# Altium footprint library con-molex.PCBLIB: 368 footprints (part 12 of 26)
Each footprint in its own frame and in the unit in brackets; x right, y up, seen from the top. Pads: shape width x height; smd on the part's side, far side on the other; paste and mask are expansions set on the pad; w line width, h text height; cw(c..) or ccw(c..) is an arc to the next point about the centre after c.
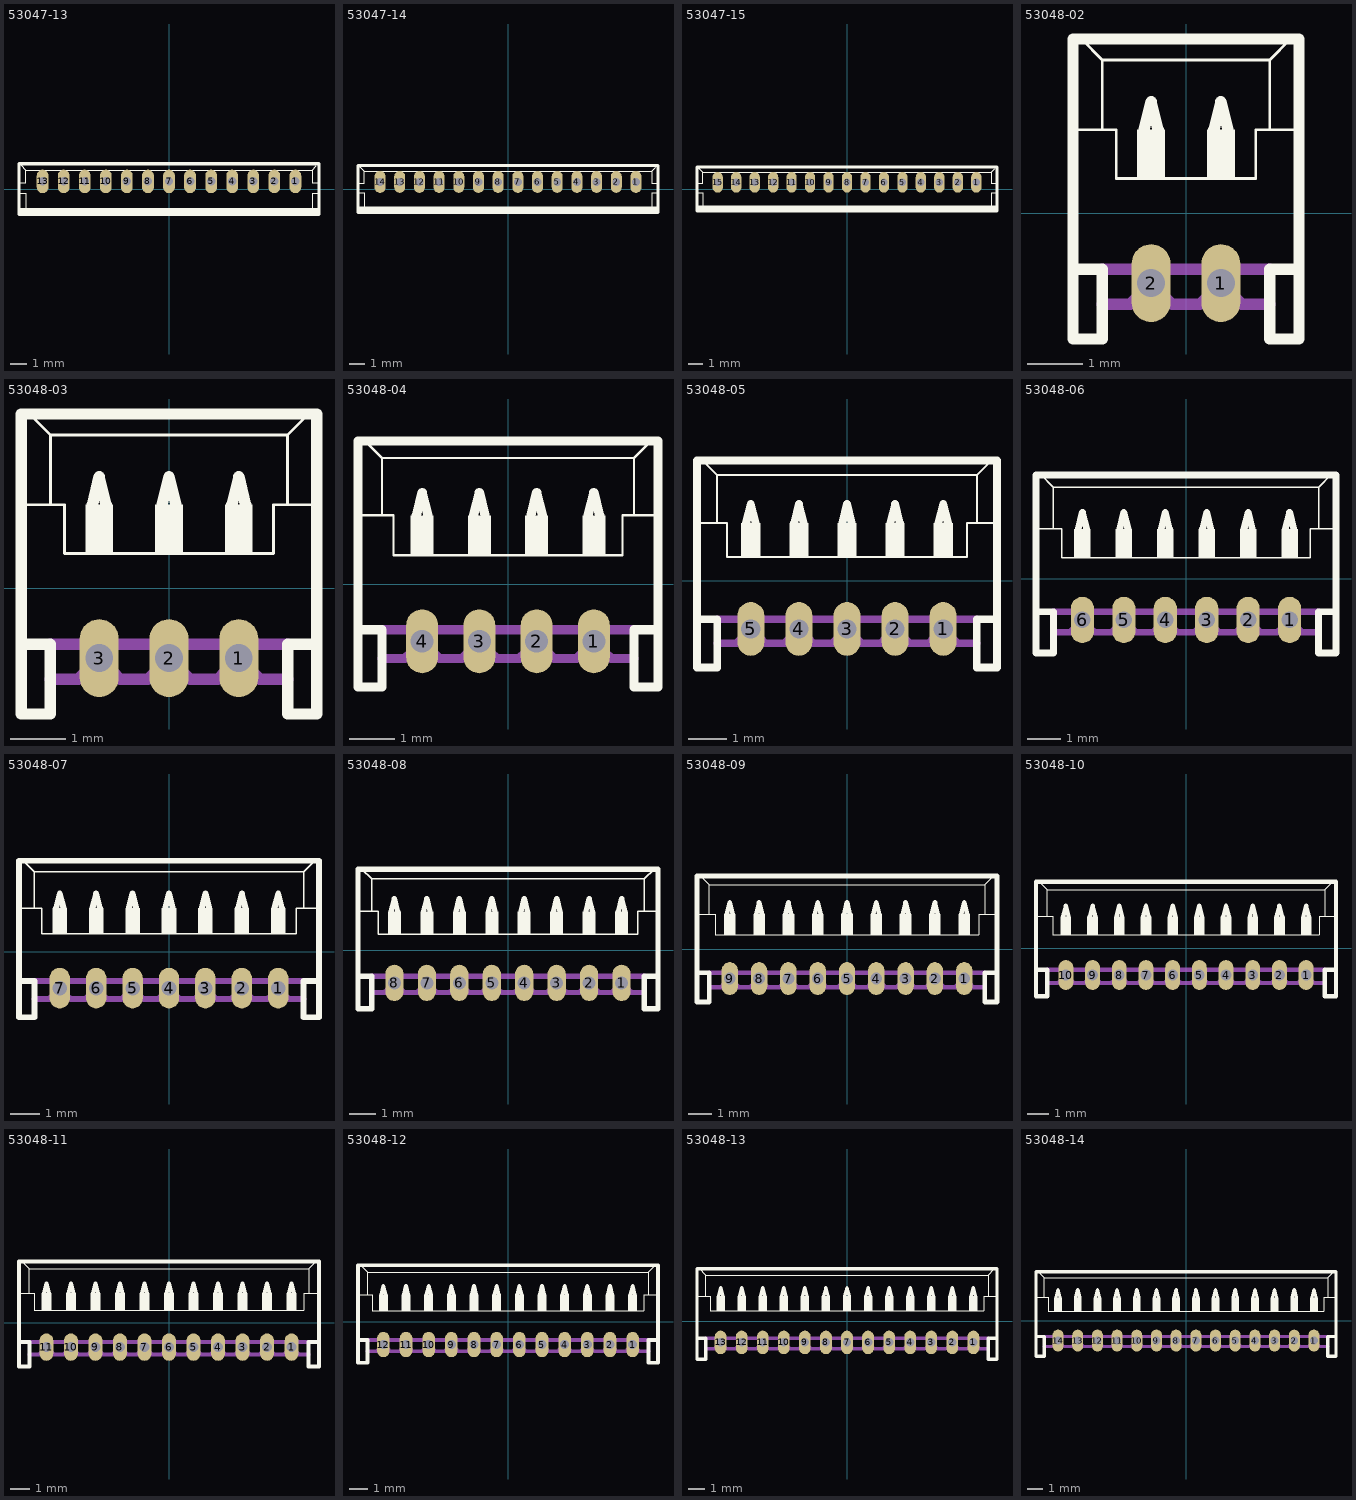
[diagram p11: the footprints below, top view; thin cyan lines are the x and y axes]

## 53047-13 [mil]
pads (13):
  oval 27.5x55 hole 19.69: 1(295.28,17.72) 2(246.06,17.72) 3(196.85,17.72) 4(147.64,17.72) 5(98.43,17.72) 6(49.21,17.72) 7(0,17.72) 8(-49.21,17.72) 9(-98.43,17.72) 10(-147.64,17.72) 11(-196.85,17.72) 12(-246.06,17.72) 13(-295.28,17.72)
Top Overlay:
  rectangle: -349.41,-59.06 349.41,-44.29
  lines w2: -349.41,-9.84 -334.65,-9.84 -334.65,-49.21 ; -349.41,14.76 -334.65,14.76 -334.65,44.29 ; -344.49,54.13 -334.65,44.29 ; 334.65,-49.21 334.65,-9.84 349.41,-9.84 ; 344.49,54.13 334.65,44.29 ; 349.41,14.76 334.65,14.76 334.65,44.29 ; -334.65,44.29 334.65,44.29
  lines w8: -350.39,-59.06 350.39,-59.06 350.39,59.06 -350.39,59.06 -350.39,-59.06

## 53047-14 [mil]
pads (14):
  oval 27.5x55 hole 19.69: 1(319.88,17.72) 2(270.67,17.72) 3(221.46,17.72) 4(172.24,17.72) 5(123.03,17.72) 6(73.82,17.72) 7(24.61,17.72) 8(-24.61,17.72) 9(-73.82,17.72) 10(-123.03,17.72) 11(-172.24,17.72) 12(-221.46,17.72) 13(-270.67,17.72) 14(-319.88,17.72)
Top Overlay:
  rectangle: -374.02,-59.06 374.02,-44.29
  lines w2: -374.02,-9.84 -359.25,-9.84 -359.25,-49.21 ; -374.02,14.76 -359.25,14.76 -359.25,44.29 ; -369.09,54.13 -359.25,44.29 ; 359.25,-49.21 359.25,-9.84 374.02,-9.84 ; 369.09,54.13 359.25,44.29 ; 374.02,14.76 359.25,14.76 359.25,44.29 ; -359.25,44.29 359.25,44.29
  lines w8: -375,-59.06 375,-59.06 375,59.06 -375,59.06 -375,-59.06

## 53047-15 [mil]
pads (15):
  oval 27.5x55 hole 19.69: 1(344.49,17.72) 2(295.28,17.72) 3(246.06,17.72) 4(196.85,17.72) 5(147.64,17.72) 6(98.43,17.72) 7(49.21,17.72) 8(0,17.72) 9(-49.21,17.72) 10(-98.43,17.72) 11(-147.64,17.72) 12(-196.85,17.72) 13(-246.06,17.72) 14(-295.28,17.72) 15(-344.49,17.72)
Top Overlay:
  rectangle: -398.62,-59.06 398.62,-44.29
  lines w2: -398.62,-9.84 -383.86,-9.84 -383.86,-49.21 ; -398.62,14.76 -383.86,14.76 -383.86,44.29 ; -393.7,54.13 -383.86,44.29 ; 383.86,-49.21 383.86,-9.84 398.62,-9.84 ; 393.7,54.13 383.86,44.29 ; 398.62,14.76 383.86,14.76 383.86,44.29 ; -383.86,44.29 383.86,44.29
  lines w8: -399.61,-59.06 399.61,-59.06 399.61,59.06 -399.61,59.06 -399.61,-59.06

## 53048-02 [mil]
pads (2):
  oval 27.5x55 hole 19.69: 1(24.61,-49.21) 2(-24.61,-49.21)
Top Overlay:
  rectangle: -34.45,24.61 -14.76,59.06
  rectangle: 14.76,24.61 34.45,59.06
  lines w2: -78.74,59.06 -59.06,59.06 ; -73.82,123.03 -59.06,108.27 ; 73.82,123.03 59.06,108.27 ; 78.74,59.06 59.06,59.06 ; -59.06,59.06 -49.21,59.06 -49.21,24.61 49.21,24.61 49.21,59.06 59.06,59.06 ; -59.06,59.06 -59.06,108.27 ; -59.06,108.27 59.06,108.27 ; 59.06,59.06 59.06,108.27
  lines w8: -78.74,-39.37 -59.06,-39.37 -59.06,-88.58 -79.72,-88.58 -79.72,123.03 -73.82,123.03 73.82,123.03 79.72,123.03 79.72,-88.58 59.06,-88.58 59.06,-39.37 78.74,-39.37 ; -29.53,59.06 -24.61,78.74 -19.69,59.06 ; 19.69,59.06 24.61,78.74 29.53,59.06
Mechanical 16:
  rectangle: -34.45,-59.06 -14.76,-39.37
  rectangle: 14.76,-59.06 34.45,-39.37
  lines w8: -59.06,-63.98 -39.37,-63.98 -34.45,-59.06 ; -59.06,-39.37 59.06,-39.37 ; -14.76,-59.06 -9.84,-63.98 9.84,-63.98 14.76,-59.06 ; 34.45,-59.06 39.37,-63.98 59.06,-63.98

## 53048-03 [mil]
pads (3):
  oval 27.5x55 hole 19.69: 1(49.21,-49.21) 2(0,-49.21) 3(-49.21,-49.21)
Top Overlay:
  rectangle: -59.06,24.61 -39.37,59.06
  rectangle: -9.84,24.61 9.84,59.06
  rectangle: 39.37,24.61 59.06,59.06
  lines w2: -103.35,59.06 -83.66,59.06 ; -98.43,123.03 -83.66,108.27 ; 98.43,123.03 83.66,108.27 ; 103.35,59.06 83.66,59.06 ; -83.66,59.06 -73.82,59.06 -73.82,24.61 73.82,24.61 73.82,59.06 83.66,59.06 ; -83.66,59.06 -83.66,108.27 ; -83.66,108.27 83.66,108.27 ; 83.66,59.06 83.66,108.27
  lines w8: -103.35,-39.37 -83.66,-39.37 -83.66,-88.58 -104.33,-88.58 -104.33,123.03 -98.43,123.03 98.43,123.03 104.33,123.03 104.33,-88.58 83.66,-88.58 83.66,-39.37 103.35,-39.37 ; -54.13,59.06 -49.21,78.74 -44.29,59.06 ; -4.92,59.06 0,78.74 4.92,59.06 ; 44.29,59.06 49.21,78.74 54.13,59.06
Mechanical 16:
  rectangle: -59.06,-59.06 -39.37,-39.37
  rectangle: -9.84,-59.06 9.84,-39.37
  rectangle: 39.37,-59.06 59.06,-39.37
  lines w8: -83.66,-63.98 -63.98,-63.98 -59.06,-59.06 ; -83.66,-39.37 83.66,-39.37 ; -39.37,-59.06 -34.45,-63.98 -14.76,-63.98 -9.84,-59.06 ; 9.84,-59.06 14.76,-63.98 34.45,-63.98 39.37,-59.06 ; 59.06,-59.06 63.98,-63.98 83.66,-63.98

## 53048-04 [mil]
pads (4):
  oval 27.5x55 hole 19.69: 1(73.82,-49.21) 2(24.61,-49.21) 3(-24.61,-49.21) 4(-73.82,-49.21)
Top Overlay:
  rectangle: -83.66,24.61 -63.98,59.06
  rectangle: -34.45,24.61 -14.76,59.06
  rectangle: 14.76,24.61 34.45,59.06
  rectangle: 63.98,24.61 83.66,59.06
  lines w2: -127.95,59.06 -108.27,59.06 ; -123.03,123.03 -108.27,108.27 ; 123.03,123.03 108.27,108.27 ; 127.95,59.06 108.27,59.06 ; -108.27,59.06 -98.43,59.06 -98.43,24.61 98.43,24.61 98.43,59.06 108.27,59.06 ; -108.27,59.06 -108.27,108.27 ; -108.27,108.27 108.27,108.27 ; 108.27,59.06 108.27,108.27
  lines w8: -127.95,-39.37 -108.27,-39.37 -108.27,-88.58 -128.94,-88.58 -128.94,123.03 -123.03,123.03 123.03,123.03 128.94,123.03 128.94,-88.58 108.27,-88.58 108.27,-39.37 127.95,-39.37 ; -78.74,59.06 -73.82,78.74 -68.9,59.06 ; -29.53,59.06 -24.61,78.74 -19.69,59.06 ; 19.69,59.06 24.61,78.74 29.53,59.06 ; 68.9,59.06 73.82,78.74 78.74,59.06
Mechanical 16:
  rectangle: -83.66,-59.06 -63.98,-39.37
  rectangle: -34.45,-59.06 -14.76,-39.37
  rectangle: 14.76,-59.06 34.45,-39.37
  rectangle: 63.98,-59.06 83.66,-39.37
  lines w8: -108.27,-63.98 -88.58,-63.98 -83.66,-59.06 ; -108.27,-39.37 108.27,-39.37 ; -63.98,-59.06 -59.06,-63.98 -39.37,-63.98 -34.45,-59.06 ; -14.76,-59.06 -9.84,-63.98 9.84,-63.98 14.76,-59.06 ; 34.45,-59.06 39.37,-63.98 59.06,-63.98 63.98,-59.06 ; 83.66,-59.06 88.58,-63.98 108.27,-63.98

## 53048-05 [mil]
pads (5):
  oval 27.5x55 hole 19.69: 1(98.43,-49.21) 2(49.21,-49.21) 3(0,-49.21) 4(-49.21,-49.21) 5(-98.43,-49.21)
Top Overlay:
  rectangle: -108.27,24.61 -88.58,59.06
  rectangle: -59.06,24.61 -39.37,59.06
  rectangle: -9.84,24.61 9.84,59.06
  rectangle: 39.37,24.61 59.06,59.06
  rectangle: 88.58,24.61 108.27,59.06
  lines w2: -152.56,59.06 -132.87,59.06 ; -147.64,123.03 -132.87,108.27 ; 147.64,123.03 132.87,108.27 ; 152.56,59.06 132.87,59.06 ; -132.87,59.06 -123.03,59.06 -123.03,24.61 123.03,24.61 123.03,59.06 132.87,59.06 ; -132.87,59.06 -132.87,108.27 ; -132.87,108.27 132.87,108.27 ; 132.87,59.06 132.87,108.27
  lines w8: -152.56,-39.37 -132.87,-39.37 -132.87,-88.58 -153.54,-88.58 -153.54,123.03 -147.64,123.03 147.64,123.03 153.54,123.03 153.54,-88.58 132.87,-88.58 132.87,-39.37 152.56,-39.37 ; -103.35,59.06 -98.43,78.74 -93.5,59.06 ; -54.13,59.06 -49.21,78.74 -44.29,59.06 ; -4.92,59.06 0,78.74 4.92,59.06 ; 44.29,59.06 49.21,78.74 54.13,59.06 ; 93.5,59.06 98.43,78.74 103.35,59.06
Mechanical 16:
  rectangle: -108.27,-59.06 -88.58,-39.37
  rectangle: -59.06,-59.06 -39.37,-39.37
  rectangle: -9.84,-59.06 9.84,-39.37
  rectangle: 39.37,-59.06 59.06,-39.37
  rectangle: 88.58,-59.06 108.27,-39.37
  lines w8: -132.87,-63.98 -113.19,-63.98 -108.27,-59.06 ; -132.87,-39.37 132.87,-39.37 ; -88.58,-59.06 -83.66,-63.98 -63.98,-63.98 -59.06,-59.06 ; -39.37,-59.06 -34.45,-63.98 -14.76,-63.98 -9.84,-59.06 ; 9.84,-59.06 14.76,-63.98 34.45,-63.98 39.37,-59.06 ; 59.06,-59.06 63.98,-63.98 83.66,-63.98 88.58,-59.06 ; 108.27,-59.06 113.19,-63.98 132.87,-63.98

## 53048-06 [mil]
pads (6):
  oval 27.5x55 hole 19.69: 1(123.03,-49.21) 2(73.82,-49.21) 3(24.61,-49.21) 4(-24.61,-49.21) 5(-73.82,-49.21) 6(-123.03,-49.21)
Top Overlay:
  rectangle: -132.87,24.61 -113.19,59.06
  rectangle: -83.66,24.61 -63.98,59.06
  rectangle: -34.45,24.61 -14.76,59.06
  rectangle: 14.76,24.61 34.45,59.06
  rectangle: 63.98,24.61 83.66,59.06
  rectangle: 113.19,24.61 132.87,59.06
  lines w2: -177.17,59.06 -157.48,59.06 ; -172.24,123.03 -157.48,108.27 ; 172.24,123.03 157.48,108.27 ; 177.17,59.06 157.48,59.06 ; -157.48,59.06 -147.64,59.06 -147.64,24.61 147.64,24.61 147.64,59.06 157.48,59.06 ; -157.48,59.06 -157.48,108.27 ; -157.48,108.27 157.48,108.27 ; 157.48,59.06 157.48,108.27
  lines w8: -177.17,-39.37 -157.48,-39.37 -157.48,-88.58 -178.15,-88.58 -178.15,123.03 -172.24,123.03 172.24,123.03 178.15,123.03 178.15,-88.58 157.48,-88.58 157.48,-39.37 177.17,-39.37 ; -127.95,59.06 -123.03,78.74 -118.11,59.06 ; -78.74,59.06 -73.82,78.74 -68.9,59.06 ; -29.53,59.06 -24.61,78.74 -19.69,59.06 ; 19.69,59.06 24.61,78.74 29.53,59.06 ; 68.9,59.06 73.82,78.74 78.74,59.06 ; 118.11,59.06 123.03,78.74 127.95,59.06
Mechanical 16:
  rectangle: -132.87,-59.06 -113.19,-39.37
  rectangle: -83.66,-59.06 -63.98,-39.37
  rectangle: -34.45,-59.06 -14.76,-39.37
  rectangle: 14.76,-59.06 34.45,-39.37
  rectangle: 63.98,-59.06 83.66,-39.37
  rectangle: 113.19,-59.06 132.87,-39.37
  lines w8: -157.48,-63.98 -137.8,-63.98 -132.87,-59.06 ; -157.48,-39.37 157.48,-39.37 ; -113.19,-59.06 -108.27,-63.98 -88.58,-63.98 -83.66,-59.06 ; -63.98,-59.06 -59.06,-63.98 -39.37,-63.98 -34.45,-59.06 ; -14.76,-59.06 -9.84,-63.98 9.84,-63.98 14.76,-59.06 ; 34.45,-59.06 39.37,-63.98 59.06,-63.98 63.98,-59.06 ; 83.66,-59.06 88.58,-63.98 108.27,-63.98 113.19,-59.06 ; 132.87,-59.06 137.8,-63.98 157.48,-63.98

## 53048-07 [mil]
pads (7):
  oval 27.5x55 hole 19.69: 1(147.64,-49.21) 2(98.43,-49.21) 3(49.21,-49.21) 4(0,-49.21) 5(-49.21,-49.21) 6(-98.43,-49.21) 7(-147.64,-49.21)
Top Overlay:
  rectangle: -157.48,24.61 -137.8,59.06
  rectangle: -108.27,24.61 -88.58,59.06
  rectangle: -59.06,24.61 -39.37,59.06
  rectangle: -9.84,24.61 9.84,59.06
  rectangle: 39.37,24.61 59.06,59.06
  rectangle: 88.58,24.61 108.27,59.06
  rectangle: 137.8,24.61 157.48,59.06
  lines w2: -201.77,59.06 -182.09,59.06 ; -196.85,123.03 -182.09,108.27 ; 196.85,123.03 182.09,108.27 ; 201.77,59.06 182.09,59.06 ; -182.09,59.06 -172.24,59.06 -172.24,24.61 172.24,24.61 172.24,59.06 182.09,59.06 ; -182.09,59.06 -182.09,108.27 ; -182.09,108.27 182.09,108.27 ; 182.09,59.06 182.09,108.27
  lines w8: -201.77,-39.37 -182.09,-39.37 -182.09,-88.58 -202.76,-88.58 -202.76,123.03 -196.85,123.03 196.85,123.03 202.76,123.03 202.76,-88.58 182.09,-88.58 182.09,-39.37 201.77,-39.37 ; -152.56,59.06 -147.64,78.74 -142.72,59.06 ; -103.35,59.06 -98.43,78.74 -93.5,59.06 ; -54.13,59.06 -49.21,78.74 -44.29,59.06 ; -4.92,59.06 0,78.74 4.92,59.06 ; 44.29,59.06 49.21,78.74 54.13,59.06 ; 93.5,59.06 98.43,78.74 103.35,59.06 ; 142.72,59.06 147.64,78.74 152.56,59.06
Mechanical 16:
  rectangle: -157.48,-59.06 -137.8,-39.37
  rectangle: -108.27,-59.06 -88.58,-39.37
  rectangle: -59.06,-59.06 -39.37,-39.37
  rectangle: -9.84,-59.06 9.84,-39.37
  rectangle: 39.37,-59.06 59.06,-39.37
  rectangle: 88.58,-59.06 108.27,-39.37
  rectangle: 137.8,-59.06 157.48,-39.37
  lines w8: -182.09,-63.98 -162.4,-63.98 -157.48,-59.06 ; -182.09,-39.37 182.09,-39.37 ; -137.8,-59.06 -132.87,-63.98 -113.19,-63.98 -108.27,-59.06 ; -88.58,-59.06 -83.66,-63.98 -63.98,-63.98 -59.06,-59.06 ; -39.37,-59.06 -34.45,-63.98 -14.76,-63.98 -9.84,-59.06 ; 9.84,-59.06 14.76,-63.98 34.45,-63.98 39.37,-59.06 ; 59.06,-59.06 63.98,-63.98 83.66,-63.98 88.58,-59.06 ; 108.27,-59.06 113.19,-63.98 132.87,-63.98 137.8,-59.06 ; 157.48,-59.06 162.4,-63.98 182.09,-63.98

## 53048-08 [mil]
pads (8):
  oval 27.5x55 hole 19.69: 1(172.24,-49.21) 2(123.03,-49.21) 3(73.82,-49.21) 4(24.61,-49.21) 5(-24.61,-49.21) 6(-73.82,-49.21) 7(-123.03,-49.21) 8(-172.24,-49.21)
Top Overlay:
  rectangle: -182.09,24.61 -162.4,59.06
  rectangle: -132.87,24.61 -113.19,59.06
  rectangle: -83.66,24.61 -63.98,59.06
  rectangle: -34.45,24.61 -14.76,59.06
  rectangle: 14.76,24.61 34.45,59.06
  rectangle: 63.98,24.61 83.66,59.06
  rectangle: 113.19,24.61 132.87,59.06
  rectangle: 162.4,24.61 182.09,59.06
  lines w2: -226.38,59.06 -206.69,59.06 ; -221.46,123.03 -206.69,108.27 ; 221.46,123.03 206.69,108.27 ; 226.38,59.06 206.69,59.06 ; -206.69,59.06 -196.85,59.06 -196.85,24.61 196.85,24.61 196.85,59.06 206.69,59.06 ; -206.69,59.06 -206.69,108.27 ; -206.69,108.27 206.69,108.27 ; 206.69,59.06 206.69,108.27
  lines w8: -226.38,-39.37 -206.69,-39.37 -206.69,-88.58 -227.36,-88.58 -227.36,123.03 -221.46,123.03 221.46,123.03 227.36,123.03 227.36,-88.58 206.69,-88.58 206.69,-39.37 226.38,-39.37 ; -177.17,59.06 -172.24,78.74 -167.32,59.06 ; -127.95,59.06 -123.03,78.74 -118.11,59.06 ; -78.74,59.06 -73.82,78.74 -68.9,59.06 ; -29.53,59.06 -24.61,78.74 -19.69,59.06 ; 19.69,59.06 24.61,78.74 29.53,59.06 ; 68.9,59.06 73.82,78.74 78.74,59.06 ; 118.11,59.06 123.03,78.74 127.95,59.06 ; 167.32,59.06 172.24,78.74 177.17,59.06
Mechanical 16:
  rectangle: -182.09,-59.06 -162.4,-39.37
  rectangle: -132.87,-59.06 -113.19,-39.37
  rectangle: -83.66,-59.06 -63.98,-39.37
  rectangle: -34.45,-59.06 -14.76,-39.37
  rectangle: 14.76,-59.06 34.45,-39.37
  rectangle: 63.98,-59.06 83.66,-39.37
  rectangle: 113.19,-59.06 132.87,-39.37
  rectangle: 162.4,-59.06 182.09,-39.37
  lines w8: -206.69,-63.98 -187.01,-63.98 -182.09,-59.06 ; -206.69,-39.37 206.69,-39.37 ; -162.4,-59.06 -157.48,-63.98 -137.8,-63.98 -132.87,-59.06 ; -113.19,-59.06 -108.27,-63.98 -88.58,-63.98 -83.66,-59.06 ; -63.98,-59.06 -59.06,-63.98 -39.37,-63.98 -34.45,-59.06 ; -14.76,-59.06 -9.84,-63.98 9.84,-63.98 14.76,-59.06 ; 34.45,-59.06 39.37,-63.98 59.06,-63.98 63.98,-59.06 ; 83.66,-59.06 88.58,-63.98 108.27,-63.98 113.19,-59.06 ; 132.87,-59.06 137.8,-63.98 157.48,-63.98 162.4,-59.06 ; 182.09,-59.06 187.01,-63.98 206.69,-63.98

## 53048-09 [mil]
pads (9):
  oval 27.5x55 hole 19.69: 1(196.85,-49.21) 2(147.64,-49.21) 3(98.43,-49.21) 4(49.21,-49.21) 5(0,-49.21) 6(-49.21,-49.21) 7(-98.43,-49.21) 8(-147.64,-49.21) 9(-196.85,-49.21)
Top Overlay:
  rectangle: -206.69,24.61 -187.01,59.06
  rectangle: -157.48,24.61 -137.8,59.06
  rectangle: -108.27,24.61 -88.58,59.06
  rectangle: -59.06,24.61 -39.37,59.06
  rectangle: -9.84,24.61 9.84,59.06
  rectangle: 39.37,24.61 59.06,59.06
  rectangle: 88.58,24.61 108.27,59.06
  rectangle: 137.8,24.61 157.48,59.06
  rectangle: 187.01,24.61 206.69,59.06
  lines w2: -250.98,59.06 -231.3,59.06 ; -246.06,123.03 -231.3,108.27 ; 246.06,123.03 231.3,108.27 ; 250.98,59.06 231.3,59.06 ; -231.3,59.06 -221.46,59.06 -221.46,24.61 221.46,24.61 221.46,59.06 231.3,59.06 ; -231.3,59.06 -231.3,108.27 ; -231.3,108.27 231.3,108.27 ; 231.3,59.06 231.3,108.27
  lines w8: -250.98,-39.37 -231.3,-39.37 -231.3,-88.58 -251.97,-88.58 -251.97,123.03 -246.06,123.03 246.06,123.03 251.97,123.03 251.97,-88.58 231.3,-88.58 231.3,-39.37 250.98,-39.37 ; -201.77,59.06 -196.85,78.74 -191.93,59.06 ; -152.56,59.06 -147.64,78.74 -142.72,59.06 ; -103.35,59.06 -98.43,78.74 -93.5,59.06 ; -54.13,59.06 -49.21,78.74 -44.29,59.06 ; -4.92,59.06 0,78.74 4.92,59.06 ; 44.29,59.06 49.21,78.74 54.13,59.06 ; 93.5,59.06 98.43,78.74 103.35,59.06 ; 142.72,59.06 147.64,78.74 152.56,59.06 ; 191.93,59.06 196.85,78.74 201.77,59.06
Mechanical 16:
  rectangle: -206.69,-59.06 -187.01,-39.37
  rectangle: -157.48,-59.06 -137.8,-39.37
  rectangle: -108.27,-59.06 -88.58,-39.37
  rectangle: -59.06,-59.06 -39.37,-39.37
  rectangle: -9.84,-59.06 9.84,-39.37
  rectangle: 39.37,-59.06 59.06,-39.37
  rectangle: 88.58,-59.06 108.27,-39.37
  rectangle: 137.8,-59.06 157.48,-39.37
  rectangle: 187.01,-59.06 206.69,-39.37
  lines w8: -231.3,-63.98 -211.61,-63.98 -206.69,-59.06 ; -231.3,-39.37 231.3,-39.37 ; -187.01,-59.06 -182.09,-63.98 -162.4,-63.98 -157.48,-59.06 ; -137.8,-59.06 -132.87,-63.98 -113.19,-63.98 -108.27,-59.06 ; -88.58,-59.06 -83.66,-63.98 -63.98,-63.98 -59.06,-59.06 ; -39.37,-59.06 -34.45,-63.98 -14.76,-63.98 -9.84,-59.06 ; 9.84,-59.06 14.76,-63.98 34.45,-63.98 39.37,-59.06 ; 59.06,-59.06 63.98,-63.98 83.66,-63.98 88.58,-59.06 ; 108.27,-59.06 113.19,-63.98 132.87,-63.98 137.8,-59.06 ; 157.48,-59.06 162.4,-63.98 182.09,-63.98 187.01,-59.06 ; 206.69,-59.06 211.61,-63.98 231.3,-63.98

## 53048-10 [mil]
pads (10):
  oval 27.5x55 hole 19.69: 1(221.46,-49.21) 2(172.24,-49.21) 3(123.03,-49.21) 4(73.82,-49.21) 5(24.61,-49.21) 6(-24.61,-49.21) 7(-73.82,-49.21) 8(-123.03,-49.21) 9(-172.24,-49.21) 10(-221.46,-49.21)
Top Overlay:
  rectangle: -231.3,24.61 -211.61,59.06
  rectangle: -182.09,24.61 -162.4,59.06
  rectangle: -132.87,24.61 -113.19,59.06
  rectangle: -83.66,24.61 -63.98,59.06
  rectangle: -34.45,24.61 -14.76,59.06
  rectangle: 14.76,24.61 34.45,59.06
  rectangle: 63.98,24.61 83.66,59.06
  rectangle: 113.19,24.61 132.87,59.06
  rectangle: 162.4,24.61 182.09,59.06
  rectangle: 211.61,24.61 231.3,59.06
  lines w2: -275.59,59.06 -255.91,59.06 ; -270.67,123.03 -255.91,108.27 ; 270.67,123.03 255.91,108.27 ; 275.59,59.06 255.91,59.06 ; -255.91,59.06 -246.06,59.06 -246.06,24.61 246.06,24.61 246.06,59.06 255.91,59.06 ; -255.91,59.06 -255.91,108.27 ; -255.91,108.27 255.91,108.27 ; 255.91,59.06 255.91,108.27
  lines w8: -275.59,-39.37 -255.91,-39.37 -255.91,-88.58 -276.57,-88.58 -276.57,123.03 -270.67,123.03 270.67,123.03 276.57,123.03 276.57,-88.58 255.91,-88.58 255.91,-39.37 275.59,-39.37 ; -226.38,59.06 -221.46,78.74 -216.54,59.06 ; -177.17,59.06 -172.24,78.74 -167.32,59.06 ; -127.95,59.06 -123.03,78.74 -118.11,59.06 ; -78.74,59.06 -73.82,78.74 -68.9,59.06 ; -29.53,59.06 -24.61,78.74 -19.69,59.06 ; 19.69,59.06 24.61,78.74 29.53,59.06 ; 68.9,59.06 73.82,78.74 78.74,59.06 ; 118.11,59.06 123.03,78.74 127.95,59.06 ; 167.32,59.06 172.24,78.74 177.17,59.06 ; 216.54,59.06 221.46,78.74 226.38,59.06
Mechanical 16:
  rectangle: -231.3,-59.06 -211.61,-39.37
  rectangle: -182.09,-59.06 -162.4,-39.37
  rectangle: -132.87,-59.06 -113.19,-39.37
  rectangle: -83.66,-59.06 -63.98,-39.37
  rectangle: -34.45,-59.06 -14.76,-39.37
  rectangle: 14.76,-59.06 34.45,-39.37
  rectangle: 63.98,-59.06 83.66,-39.37
  rectangle: 113.19,-59.06 132.87,-39.37
  rectangle: 162.4,-59.06 182.09,-39.37
  rectangle: 211.61,-59.06 231.3,-39.37
  lines w8: -255.91,-63.98 -236.22,-63.98 -231.3,-59.06 ; -255.91,-39.37 255.91,-39.37 ; -211.61,-59.06 -206.69,-63.98 -187.01,-63.98 -182.09,-59.06 ; -162.4,-59.06 -157.48,-63.98 -137.8,-63.98 -132.87,-59.06 ; -113.19,-59.06 -108.27,-63.98 -88.58,-63.98 -83.66,-59.06 ; -63.98,-59.06 -59.06,-63.98 -39.37,-63.98 -34.45,-59.06 ; -14.76,-59.06 -9.84,-63.98 9.84,-63.98 14.76,-59.06 ; 34.45,-59.06 39.37,-63.98 59.06,-63.98 63.98,-59.06 ; 83.66,-59.06 88.58,-63.98 108.27,-63.98 113.19,-59.06 ; 132.87,-59.06 137.8,-63.98 157.48,-63.98 162.4,-59.06 ; 182.09,-59.06 187.01,-63.98 206.69,-63.98 211.61,-59.06 ; 231.3,-59.06 236.22,-63.98 255.91,-63.98

## 53048-11 [mil]
pads (11):
  oval 27.5x55 hole 19.69: 1(246.06,-49.21) 2(196.85,-49.21) 3(147.64,-49.21) 4(98.43,-49.21) 5(49.21,-49.21) 6(0,-49.21) 7(-49.21,-49.21) 8(-98.43,-49.21) 9(-147.64,-49.21) 10(-196.85,-49.21) 11(-246.06,-49.21)
Top Overlay:
  rectangle: -255.91,24.61 -236.22,59.06
  rectangle: -206.69,24.61 -187.01,59.06
  rectangle: -157.48,24.61 -137.8,59.06
  rectangle: -108.27,24.61 -88.58,59.06
  rectangle: -59.06,24.61 -39.37,59.06
  rectangle: -9.84,24.61 9.84,59.06
  rectangle: 39.37,24.61 59.06,59.06
  rectangle: 88.58,24.61 108.27,59.06
  rectangle: 137.8,24.61 157.48,59.06
  rectangle: 187.01,24.61 206.69,59.06
  rectangle: 236.22,24.61 255.91,59.06
  lines w2: -300.2,59.06 -280.51,59.06 ; -295.28,123.03 -280.51,108.27 ; 295.28,123.03 280.51,108.27 ; 300.2,59.06 280.51,59.06 ; -280.51,59.06 -270.67,59.06 -270.67,24.61 270.67,24.61 270.67,59.06 280.51,59.06 ; -280.51,59.06 -280.51,108.27 ; -280.51,108.27 280.51,108.27 ; 280.51,59.06 280.51,108.27
  lines w8: -300.2,-39.37 -280.51,-39.37 -280.51,-88.58 -301.18,-88.58 -301.18,123.03 -295.28,123.03 295.28,123.03 301.18,123.03 301.18,-88.58 280.51,-88.58 280.51,-39.37 300.2,-39.37 ; -250.98,59.06 -246.06,78.74 -241.14,59.06 ; -201.77,59.06 -196.85,78.74 -191.93,59.06 ; -152.56,59.06 -147.64,78.74 -142.72,59.06 ; -103.35,59.06 -98.43,78.74 -93.5,59.06 ; -54.13,59.06 -49.21,78.74 -44.29,59.06 ; -4.92,59.06 0,78.74 4.92,59.06 ; 44.29,59.06 49.21,78.74 54.13,59.06 ; 93.5,59.06 98.43,78.74 103.35,59.06 ; 142.72,59.06 147.64,78.74 152.56,59.06 ; 191.93,59.06 196.85,78.74 201.77,59.06 ; 241.14,59.06 246.06,78.74 250.98,59.06
Mechanical 16:
  rectangle: -255.91,-59.06 -236.22,-39.37
  rectangle: -206.69,-59.06 -187.01,-39.37
  rectangle: -157.48,-59.06 -137.8,-39.37
  rectangle: -108.27,-59.06 -88.58,-39.37
  rectangle: -59.06,-59.06 -39.37,-39.37
  rectangle: -9.84,-59.06 9.84,-39.37
  rectangle: 39.37,-59.06 59.06,-39.37
  rectangle: 88.58,-59.06 108.27,-39.37
  rectangle: 137.8,-59.06 157.48,-39.37
  rectangle: 187.01,-59.06 206.69,-39.37
  rectangle: 236.22,-59.06 255.91,-39.37
  lines w8: -280.51,-63.98 -260.83,-63.98 -255.91,-59.06 ; -280.51,-39.37 280.51,-39.37 ; -236.22,-59.06 -231.3,-63.98 -211.61,-63.98 -206.69,-59.06 ; -187.01,-59.06 -182.09,-63.98 -162.4,-63.98 -157.48,-59.06 ; -137.8,-59.06 -132.87,-63.98 -113.19,-63.98 -108.27,-59.06 ; -88.58,-59.06 -83.66,-63.98 -63.98,-63.98 -59.06,-59.06 ; -39.37,-59.06 -34.45,-63.98 -14.76,-63.98 -9.84,-59.06 ; 9.84,-59.06 14.76,-63.98 34.45,-63.98 39.37,-59.06 ; 59.06,-59.06 63.98,-63.98 83.66,-63.98 88.58,-59.06 ; 108.27,-59.06 113.19,-63.98 132.87,-63.98 137.8,-59.06 ; 157.48,-59.06 162.4,-63.98 182.09,-63.98 187.01,-59.06 ; 206.69,-59.06 211.61,-63.98 231.3,-63.98 236.22,-59.06 ; 255.91,-59.06 260.83,-63.98 280.51,-63.98

## 53048-12 [mil]
pads (12):
  oval 27.5x55 hole 19.69: 1(270.67,-49.21) 2(221.46,-49.21) 3(172.24,-49.21) 4(123.03,-49.21) 5(73.82,-49.21) 6(24.61,-49.21) 7(-24.61,-49.21) 8(-73.82,-49.21) 9(-123.03,-49.21) 10(-172.24,-49.21) 11(-221.46,-49.21) 12(-270.67,-49.21)
Top Overlay:
  rectangle: -280.51,24.61 -260.83,59.06
  rectangle: -231.3,24.61 -211.61,59.06
  rectangle: -182.09,24.61 -162.4,59.06
  rectangle: -132.87,24.61 -113.19,59.06
  rectangle: -83.66,24.61 -63.98,59.06
  rectangle: -34.45,24.61 -14.76,59.06
  rectangle: 14.76,24.61 34.45,59.06
  rectangle: 63.98,24.61 83.66,59.06
  rectangle: 113.19,24.61 132.87,59.06
  rectangle: 162.4,24.61 182.09,59.06
  rectangle: 211.61,24.61 231.3,59.06
  rectangle: 260.83,24.61 280.51,59.06
  lines w2: -324.8,59.06 -305.12,59.06 ; -319.88,123.03 -305.12,108.27 ; 319.88,123.03 305.12,108.27 ; 324.8,59.06 305.12,59.06 ; -305.12,59.06 -295.28,59.06 -295.28,24.61 295.28,24.61 295.28,59.06 305.12,59.06 ; -305.12,59.06 -305.12,108.27 ; -305.12,108.27 305.12,108.27 ; 305.12,59.06 305.12,108.27
  lines w8: -324.8,-39.37 -305.12,-39.37 -305.12,-88.58 -325.79,-88.58 -325.79,123.03 -319.88,123.03 319.88,123.03 325.79,123.03 325.79,-88.58 305.12,-88.58 305.12,-39.37 324.8,-39.37 ; -275.59,59.06 -270.67,78.74 -265.75,59.06 ; -226.38,59.06 -221.46,78.74 -216.54,59.06 ; -177.17,59.06 -172.24,78.74 -167.32,59.06 ; -127.95,59.06 -123.03,78.74 -118.11,59.06 ; -78.74,59.06 -73.82,78.74 -68.9,59.06 ; -29.53,59.06 -24.61,78.74 -19.69,59.06 ; 19.69,59.06 24.61,78.74 29.53,59.06 ; 68.9,59.06 73.82,78.74 78.74,59.06 ; 118.11,59.06 123.03,78.74 127.95,59.06 ; 167.32,59.06 172.24,78.74 177.17,59.06 ; 216.54,59.06 221.46,78.74 226.38,59.06 ; 265.75,59.06 270.67,78.74 275.59,59.06
Mechanical 16:
  rectangle: -280.51,-59.06 -260.83,-39.37
  rectangle: -231.3,-59.06 -211.61,-39.37
  rectangle: -182.09,-59.06 -162.4,-39.37
  rectangle: -132.87,-59.06 -113.19,-39.37
  rectangle: -83.66,-59.06 -63.98,-39.37
  rectangle: -34.45,-59.06 -14.76,-39.37
  rectangle: 14.76,-59.06 34.45,-39.37
  rectangle: 63.98,-59.06 83.66,-39.37
  rectangle: 113.19,-59.06 132.87,-39.37
  rectangle: 162.4,-59.06 182.09,-39.37
  rectangle: 211.61,-59.06 231.3,-39.37
  rectangle: 260.83,-59.06 280.51,-39.37
  lines w8: -305.12,-63.98 -285.43,-63.98 -280.51,-59.06 ; -305.12,-39.37 305.12,-39.37 ; -260.83,-59.06 -255.91,-63.98 -236.22,-63.98 -231.3,-59.06 ; -211.61,-59.06 -206.69,-63.98 -187.01,-63.98 -182.09,-59.06 ; -162.4,-59.06 -157.48,-63.98 -137.8,-63.98 -132.87,-59.06 ; -113.19,-59.06 -108.27,-63.98 -88.58,-63.98 -83.66,-59.06 ; -63.98,-59.06 -59.06,-63.98 -39.37,-63.98 -34.45,-59.06 ; -14.76,-59.06 -9.84,-63.98 9.84,-63.98 14.76,-59.06 ; 34.45,-59.06 39.37,-63.98 59.06,-63.98 63.98,-59.06 ; 83.66,-59.06 88.58,-63.98 108.27,-63.98 113.19,-59.06 ; 132.87,-59.06 137.8,-63.98 157.48,-63.98 162.4,-59.06 ; 182.09,-59.06 187.01,-63.98 206.69,-63.98 211.61,-59.06 ; 231.3,-59.06 236.22,-63.98 255.91,-63.98 260.83,-59.06 ; 280.51,-59.06 285.43,-63.98 305.12,-63.98

## 53048-13 [mil]
pads (13):
  oval 27.5x55 hole 19.69: 1(295.28,-49.21) 2(246.06,-49.21) 3(196.85,-49.21) 4(147.64,-49.21) 5(98.43,-49.21) 6(49.21,-49.21) 7(0,-49.21) 8(-49.21,-49.21) 9(-98.43,-49.21) 10(-147.64,-49.21) 11(-196.85,-49.21) 12(-246.06,-49.21) 13(-295.28,-49.21)
Top Overlay:
  rectangle: -305.12,24.61 -285.43,59.06
  rectangle: -255.91,24.61 -236.22,59.06
  rectangle: -206.69,24.61 -187.01,59.06
  rectangle: -157.48,24.61 -137.8,59.06
  rectangle: -108.27,24.61 -88.58,59.06
  rectangle: -59.06,24.61 -39.37,59.06
  rectangle: -9.84,24.61 9.84,59.06
  rectangle: 39.37,24.61 59.06,59.06
  rectangle: 88.58,24.61 108.27,59.06
  rectangle: 137.8,24.61 157.48,59.06
  rectangle: 187.01,24.61 206.69,59.06
  rectangle: 236.22,24.61 255.91,59.06
  rectangle: 285.43,24.61 305.12,59.06
  lines w2: -349.41,59.06 -329.72,59.06 ; -344.49,123.03 -329.72,108.27 ; 344.49,123.03 329.72,108.27 ; 349.41,59.06 329.72,59.06 ; -329.72,59.06 -319.88,59.06 -319.88,24.61 319.88,24.61 319.88,59.06 329.72,59.06 ; -329.72,59.06 -329.72,108.27 ; -329.72,108.27 329.72,108.27 ; 329.72,59.06 329.72,108.27
  lines w8: -349.41,-39.37 -329.72,-39.37 -329.72,-88.58 -350.39,-88.58 -350.39,123.03 -344.49,123.03 344.49,123.03 350.39,123.03 350.39,-88.58 329.72,-88.58 329.72,-39.37 349.41,-39.37 ; -300.2,59.06 -295.28,78.74 -290.35,59.06 ; -250.98,59.06 -246.06,78.74 -241.14,59.06 ; -201.77,59.06 -196.85,78.74 -191.93,59.06 ; -152.56,59.06 -147.64,78.74 -142.72,59.06 ; -103.35,59.06 -98.43,78.74 -93.5,59.06 ; -54.13,59.06 -49.21,78.74 -44.29,59.06 ; -4.92,59.06 0,78.74 4.92,59.06 ; 44.29,59.06 49.21,78.74 54.13,59.06 ; 93.5,59.06 98.43,78.74 103.35,59.06 ; 142.72,59.06 147.64,78.74 152.56,59.06 ; 191.93,59.06 196.85,78.74 201.77,59.06 ; 241.14,59.06 246.06,78.74 250.98,59.06 ; 290.35,59.06 295.28,78.74 300.2,59.06
Mechanical 16:
  rectangle: -305.12,-59.06 -285.43,-39.37
  rectangle: -255.91,-59.06 -236.22,-39.37
  rectangle: -206.69,-59.06 -187.01,-39.37
  rectangle: -157.48,-59.06 -137.8,-39.37
  rectangle: -108.27,-59.06 -88.58,-39.37
  rectangle: -59.06,-59.06 -39.37,-39.37
  rectangle: -9.84,-59.06 9.84,-39.37
  rectangle: 39.37,-59.06 59.06,-39.37
  rectangle: 88.58,-59.06 108.27,-39.37
  rectangle: 137.8,-59.06 157.48,-39.37
  rectangle: 187.01,-59.06 206.69,-39.37
  rectangle: 236.22,-59.06 255.91,-39.37
  rectangle: 285.43,-59.06 305.12,-39.37
  lines w8: -329.72,-63.98 -310.04,-63.98 -305.12,-59.06 ; -329.72,-39.37 329.72,-39.37 ; -285.43,-59.06 -280.51,-63.98 -260.83,-63.98 -255.91,-59.06 ; -236.22,-59.06 -231.3,-63.98 -211.61,-63.98 -206.69,-59.06 ; -187.01,-59.06 -182.09,-63.98 -162.4,-63.98 -157.48,-59.06 ; -137.8,-59.06 -132.87,-63.98 -113.19,-63.98 -108.27,-59.06 ; -88.58,-59.06 -83.66,-63.98 -63.98,-63.98 -59.06,-59.06 ; -39.37,-59.06 -34.45,-63.98 -14.76,-63.98 -9.84,-59.06 ; 9.84,-59.06 14.76,-63.98 34.45,-63.98 39.37,-59.06 ; 59.06,-59.06 63.98,-63.98 83.66,-63.98 88.58,-59.06 ; 108.27,-59.06 113.19,-63.98 132.87,-63.98 137.8,-59.06 ; 157.48,-59.06 162.4,-63.98 182.09,-63.98 187.01,-59.06 ; 206.69,-59.06 211.61,-63.98 231.3,-63.98 236.22,-59.06 ; 255.91,-59.06 260.83,-63.98 280.51,-63.98 285.43,-59.06 ; 305.12,-59.06 310.04,-63.98 329.72,-63.98

## 53048-14 [mil]
pads (14):
  oval 27.5x55 hole 19.69: 1(319.88,-49.21) 2(270.67,-49.21) 3(221.46,-49.21) 4(172.24,-49.21) 5(123.03,-49.21) 6(73.82,-49.21) 7(24.61,-49.21) 8(-24.61,-49.21) 9(-73.82,-49.21) 10(-123.03,-49.21) 11(-172.24,-49.21) 12(-221.46,-49.21) 13(-270.67,-49.21) 14(-319.88,-49.21)
Top Overlay:
  rectangle: -329.72,24.61 -310.04,59.06
  rectangle: -280.51,24.61 -260.83,59.06
  rectangle: -231.3,24.61 -211.61,59.06
  rectangle: -182.09,24.61 -162.4,59.06
  rectangle: -132.87,24.61 -113.19,59.06
  rectangle: -83.66,24.61 -63.98,59.06
  rectangle: -34.45,24.61 -14.76,59.06
  rectangle: 14.76,24.61 34.45,59.06
  rectangle: 63.98,24.61 83.66,59.06
  rectangle: 113.19,24.61 132.87,59.06
  rectangle: 162.4,24.61 182.09,59.06
  rectangle: 211.61,24.61 231.3,59.06
  rectangle: 260.83,24.61 280.51,59.06
  rectangle: 310.04,24.61 329.72,59.06
  lines w2: -374.02,59.06 -354.33,59.06 ; -369.09,123.03 -354.33,108.27 ; 369.09,123.03 354.33,108.27 ; 374.02,59.06 354.33,59.06 ; -354.33,59.06 -344.49,59.06 -344.49,24.61 344.49,24.61 344.49,59.06 354.33,59.06 ; -354.33,59.06 -354.33,108.27 ; -354.33,108.27 354.33,108.27 ; 354.33,59.06 354.33,108.27
  lines w8: -374.02,-39.37 -354.33,-39.37 -354.33,-88.58 -375,-88.58 -375,123.03 -369.09,123.03 369.09,123.03 375,123.03 375,-88.58 354.33,-88.58 354.33,-39.37 374.02,-39.37 ; -324.8,59.06 -319.88,78.74 -314.96,59.06 ; -275.59,59.06 -270.67,78.74 -265.75,59.06 ; -226.38,59.06 -221.46,78.74 -216.54,59.06 ; -177.17,59.06 -172.24,78.74 -167.32,59.06 ; -127.95,59.06 -123.03,78.74 -118.11,59.06 ; -78.74,59.06 -73.82,78.74 -68.9,59.06 ; -29.53,59.06 -24.61,78.74 -19.69,59.06 ; 19.69,59.06 24.61,78.74 29.53,59.06 ; 68.9,59.06 73.82,78.74 78.74,59.06 ; 118.11,59.06 123.03,78.74 127.95,59.06 ; 167.32,59.06 172.24,78.74 177.17,59.06 ; 216.54,59.06 221.46,78.74 226.38,59.06 ; 265.75,59.06 270.67,78.74 275.59,59.06 ; 314.96,59.06 319.88,78.74 324.8,59.06
Mechanical 16:
  rectangle: -329.72,-59.06 -310.04,-39.37
  rectangle: -280.51,-59.06 -260.83,-39.37
  rectangle: -231.3,-59.06 -211.61,-39.37
  rectangle: -182.09,-59.06 -162.4,-39.37
  rectangle: -132.87,-59.06 -113.19,-39.37
  rectangle: -83.66,-59.06 -63.98,-39.37
  rectangle: -34.45,-59.06 -14.76,-39.37
  rectangle: 14.76,-59.06 34.45,-39.37
  rectangle: 63.98,-59.06 83.66,-39.37
  rectangle: 113.19,-59.06 132.87,-39.37
  rectangle: 162.4,-59.06 182.09,-39.37
  rectangle: 211.61,-59.06 231.3,-39.37
  rectangle: 260.83,-59.06 280.51,-39.37
  rectangle: 310.04,-59.06 329.72,-39.37
  lines w8: -354.33,-63.98 -334.65,-63.98 -329.72,-59.06 ; -354.33,-39.37 354.33,-39.37 ; -310.04,-59.06 -305.12,-63.98 -285.43,-63.98 -280.51,-59.06 ; -260.83,-59.06 -255.91,-63.98 -236.22,-63.98 -231.3,-59.06 ; -211.61,-59.06 -206.69,-63.98 -187.01,-63.98 -182.09,-59.06 ; -162.4,-59.06 -157.48,-63.98 -137.8,-63.98 -132.87,-59.06 ; -113.19,-59.06 -108.27,-63.98 -88.58,-63.98 -83.66,-59.06 ; -63.98,-59.06 -59.06,-63.98 -39.37,-63.98 -34.45,-59.06 ; -14.76,-59.06 -9.84,-63.98 9.84,-63.98 14.76,-59.06 ; 34.45,-59.06 39.37,-63.98 59.06,-63.98 63.98,-59.06 ; 83.66,-59.06 88.58,-63.98 108.27,-63.98 113.19,-59.06 ; 132.87,-59.06 137.8,-63.98 157.48,-63.98 162.4,-59.06 ; 182.09,-59.06 187.01,-63.98 206.69,-63.98 211.61,-59.06 ; 231.3,-59.06 236.22,-63.98 255.91,-63.98 260.83,-59.06 ; 280.51,-59.06 285.43,-63.98 305.12,-63.98 310.04,-59.06 ; 329.72,-59.06 334.65,-63.98 354.33,-63.98